# Altium footprint library 7-Connectors-12.PcbLib: 76 footprints (part 5 of 5) (continued)
## TYCO_5406203-3 [mm] "4 x RJ45 Jacks - 8 Positions" (continued)
Mechanical 15:
  lines w0.1: -0.25,0 0,0 ; 0,-0.25 0,0 ; 0,0.25 0,0 ; 0.25,0 0,0
3D body "TYCO_5406203-3.stp": height 14.55, standoff -3.94, extent -30.505,-2.916 30.505,18.42

## TYCO_5787834-1 [mm] "4 Position, Straight USB Type B Receptacle"
height 15.62
pads (6):
  round 1.7 hole 1: 1(1.25,1.605) 2(-1.25,1.605) 3(-1.25,-1.605) 4(1.25,-1.605)
  round 3 hole 2.3: 5(-6.02,-1.1) 5(6.02,-1.1)
Top Overlay:
  drawing of 188 lines, arcs and shapes, not listed
Mechanical 8:
  lines w0.1: -6.52,-1.1 -6.02,-1.1 ; -6.02,-1.6 -6.02,-1.1 ; -6.02,-0.6 -6.02,-1.1 ; -5.52,-1.1 -6.02,-1.1 ; -1.75,-1.605 -1.25,-1.605 ; -1.75,1.605 -1.25,1.605 ; -1.25,-2.105 -1.25,-1.605 ; -1.25,-1.105 -1.25,-1.605 ; -1.25,1.105 -1.25,1.605 ; -1.25,2.105 -1.25,1.605 ; -0.75,-1.605 -1.25,-1.605 ; -0.75,1.605 -1.25,1.605 ; -0.5,0 0,0 ; 0,-0.5 0,0 ; 0,0.5 0,0 ; 0.5,0 0,0 ; 0.75,-1.605 1.25,-1.605 ; 0.75,1.605 1.25,1.605 ; 1.25,-2.105 1.25,-1.605 ; 1.25,-1.105 1.25,-1.605 ; 1.25,1.105 1.25,1.605 ; 1.25,2.105 1.25,1.605 ; 1.75,-1.605 1.25,-1.605 ; 1.75,1.605 1.25,1.605 ; 5.52,-1.1 6.02,-1.1 ; 6.02,-1.6 6.02,-1.1 ; 6.02,-0.6 6.02,-1.1 ; 6.52,-1.1 6.02,-1.1
Mechanical 14:
  drawing of 314 lines, arcs and shapes, not listed
3D body "TYCO_5787834-1.stp": height 15.62, standoff -4.02, extent -7.571,-5.723 7.571,5.733

## TYCO_6367034-1 [mm] "Cage bottom For Single Port SFP  (Small Form-factor Pluggable)"
height 8.8
pads (17):
  rect 2x2 hole 1.05: 21(-30.9,7.125) 22(-20.9,7.125) 23(-10.9,7.125) 25(-25.9,-7.125) 26(-15.9,-7.125) 27(-5.9,-7.125) 28(4.1,-7.125) 29(-30.9,-1.455) 30(-10.9,-3.955) 31(-10.9,1.445)
  rect 2x2 hole 0.85: 24(-0.9,7.125)
  round 0.5 hole 0.95 unplated mask+0.25: 32(-8.1,7.125) 33(-3.4,7.125) 34(1.6,7.125) 35(-8.1,-7.125) 36(-3.4,-7.125) 37(1.6,-7.125)
Top Overlay:
  lines w0.2: -41.65,-4.605 -41.65,-3.405 ; -41.65,-0.605 -41.65,0.595 ; -41.65,3.395 -41.65,4.595 ; -36.6,-4.605 -36.6,-3.405 ; -36.6,-0.605 -36.6,0.595 ; -36.6,3.395 -36.6,4.595 ; -32.3,7.774 -42.4,7.774 -42.4,-7.774 -27.3,-7.774 ; -29.5,7.774 -22.3,7.774 ; -24.5,-7.774 -17.3,-7.774 ; -19.5,7.774 -12.3,7.774 ; -14.5,-7.774 -8.568,-7.774 ; -9.5,7.774 -8.568,7.774 ; -7.632,-7.774 -7.3,-7.774 ; -7.632,7.774 -3.868,7.774 ; -4.5,-7.774 -3.868,-7.774 ; -2.932,-7.774 1.132,-7.774 ; -2.932,7.774 -2.4,7.774 ; 0.6,7.774 1.132,7.774 ; 2.068,-7.774 2.7,-7.774 ; 2.068,7.774 6.3,7.774 6.3,5.589 ; 5.5,-7.774 6.3,-7.774 6.3,-5.599 ; 6.3,-4.011 6.3,-0.799 ; 6.3,0.789 6.3,4.001 ; -41.9,-4.905 -41.9,-4.605 -35.6,-4.605 -35.6,-4.905 -41.9,-4.905 ; -41.9,-3.405 -41.9,-3.105 -35.6,-3.105 -35.6,-3.405 -41.9,-3.405 ; -41.9,-0.905 -41.9,-0.605 -35.6,-0.605 -35.6,-0.905 -41.9,-0.905 ; -41.9,0.595 -41.9,0.895 -35.6,0.895 -35.6,0.595 -41.9,0.595 ; -41.9,3.095 -41.9,3.395 -35.6,3.395 -35.6,3.095 -41.9,3.095 ; -41.9,4.595 -41.9,4.895 -35.6,4.895 -35.6,4.595 -41.9,4.595
Mechanical 8:
  drawing of 213 lines, arcs and shapes, not listed
Mechanical 14:
  lines w0.1: -41.65,-4.605 -41.65,-3.405 ; -41.65,-0.605 -41.65,0.595 ; -41.65,3.395 -41.65,4.595 ; -36.6,-4.605 -36.6,-3.405 ; -36.6,-0.605 -36.6,0.595 ; -36.6,3.395 -36.6,4.595 ; -42.4,-7.774 6.3,-7.774 6.3,7.774 -42.4,7.774 -42.4,-7.774 ; -41.9,-4.905 -41.9,-4.605 -35.6,-4.605 -35.6,-4.905 -41.9,-4.905 ; -41.9,-3.405 -41.9,-3.105 -35.6,-3.105 -35.6,-3.405 -41.9,-3.405 ; -41.9,-0.905 -41.9,-0.605 -35.6,-0.605 -35.6,-0.905 -41.9,-0.905 ; -41.9,0.595 -41.9,0.895 -35.6,0.895 -35.6,0.595 -41.9,0.595 ; -41.9,3.095 -41.9,3.395 -35.6,3.395 -35.6,3.095 -41.9,3.095 ; -41.9,4.595 -41.9,4.895 -35.6,4.895 -35.6,4.595 -41.9,4.595
3D body "TYCO_6367034-1_(Cage Bot).stp": height 8.8, standoff -1.1, extent -42.4,-7.774 6.1,7.774

## TYCO_6367035-1 [mm] "Cage Top For Single Port SFP  (Small Form-factor Pluggable)"
height 10
pads (3):
  round 0.5 hole 0.95 unplated mask+0.25: CAGE(6.2,-4.805) CAGE(6.2,-0.005) CAGE(6.2,4.795)
Top Overlay:
  lines w0.2: -41.65,-4.605 -41.65,-3.405 ; -41.65,-0.605 -41.65,0.595 ; -41.65,3.395 -41.65,4.595 ; -36.6,-4.605 -36.6,-3.405 ; -36.6,-0.605 -36.6,0.595 ; -36.6,3.395 -36.6,4.595 ; -32.3,7.774 -42.4,7.774 -42.4,-7.774 -27.3,-7.774 ; -29.5,7.774 -22.3,7.774 ; -24.5,-7.774 -17.3,-7.774 ; -19.5,7.774 -12.3,7.774 ; -14.5,-7.774 -8.568,-7.774 ; -9.5,7.774 -8.568,7.774 ; -7.632,-7.774 -7.3,-7.774 ; -7.632,7.774 -3.868,7.774 ; -4.5,-7.774 -3.868,-7.774 ; -2.932,-7.774 1.132,-7.774 ; -2.932,7.774 -2.4,7.774 ; 0.6,7.774 1.132,7.774 ; 2.068,-7.774 2.7,-7.774 ; 2.068,7.774 6.3,7.774 6.3,5.589 ; 5.5,-7.774 6.3,-7.774 6.3,-5.599 ; 6.3,-4.011 6.3,-0.799 ; 6.3,0.789 6.3,4.001 ; -41.9,-4.905 -41.9,-4.605 -35.6,-4.605 -35.6,-4.905 -41.9,-4.905 ; -41.9,-3.405 -41.9,-3.105 -35.6,-3.105 -35.6,-3.405 -41.9,-3.405 ; -41.9,-0.905 -41.9,-0.605 -35.6,-0.605 -35.6,-0.905 -41.9,-0.905 ; -41.9,0.595 -41.9,0.895 -35.6,0.895 -35.6,0.595 -41.9,0.595 ; -41.9,3.095 -41.9,3.395 -35.6,3.395 -35.6,3.095 -41.9,3.095 ; -41.9,4.595 -41.9,4.895 -35.6,4.895 -35.6,4.595 -41.9,4.595
Mechanical 8:
  circle w0.1: c6.2,4.795 r0.425
  circle w0.1: c6.2,-0.005 r0.425
  circle w0.1: c6.2,-4.805 r0.425
  lines w0.1: -31.4,-1.455 -30.9,-1.455 ; -31.4,7.125 -30.9,7.125 ; -30.9,-1.955 -30.9,-1.455 ; -30.9,-0.955 -30.9,-1.455 ; -30.9,6.625 -30.9,7.125 ; -30.9,7.625 -30.9,7.125 ; -30.4,-1.455 -30.9,-1.455 ; -30.4,7.125 -30.9,7.125 ; -26.4,-7.125 -25.9,-7.125 ; -25.9,-7.625 -25.9,-7.125 ; -25.9,-6.625 -25.9,-7.125 ; -25.4,-7.125 -25.9,-7.125 ; -21.4,7.125 -20.9,7.125 ; -20.9,6.625 -20.9,7.125 ; -20.9,7.625 -20.9,7.125 ; -20.4,7.125 -20.9,7.125 ; -16.4,-7.125 -15.9,-7.125 ; -15.9,-7.625 -15.9,-7.125 ; -15.9,-6.625 -15.9,-7.125 ; -15.4,-7.125 -15.9,-7.125 ; -11.4,-3.955 -10.9,-3.955 ; -11.4,1.445 -10.9,1.445 ; -11.4,7.125 -10.9,7.125 ; -10.9,-4.455 -10.9,-3.955 ; -10.9,-3.455 -10.9,-3.955 ; -10.9,0.945 -10.9,1.445 ; -10.9,1.945 -10.9,1.445 ; -10.9,6.625 -10.9,7.125 ; -10.9,7.625 -10.9,7.125 ; -10.4,-3.955 -10.9,-3.955 ; -10.4,1.445 -10.9,1.445 ; -10.4,7.125 -10.9,7.125 ; -8.6,-7.125 -8.1,-7.125 ; -8.6,7.125 -8.1,7.125 ; -8.1,-7.625 -8.1,-7.125 ; -8.1,-6.625 -8.1,-7.125 ; -8.1,6.625 -8.1,7.125 ; -8.1,7.625 -8.1,7.125 ; -7.6,-7.125 -8.1,-7.125 ; -7.6,7.125 -8.1,7.125 ; -6.4,-7.125 -5.9,-7.125 ; -5.9,-7.625 -5.9,-7.125 ; -5.9,-6.625 -5.9,-7.125 ; -5.4,-7.125 -5.9,-7.125 ; -4.6,-3.805 -4.1,-3.805 -3.6,-3.805 ; -4.6,3.395 -4.1,3.395 -3.6,3.395 ; -4.1,-4.305 -4.1,3.895 ; -3.9,-7.125 -3.4,-7.125 ; -3.9,7.125 -3.4,7.125 ; -3.4,-7.625 -3.4,-7.125 ; -3.4,-6.625 -3.4,-7.125 ; -3.4,6.625 -3.4,7.125 ; -3.4,7.625 -3.4,7.125 ; -2.9,-7.125 -3.4,-7.125 ; -2.9,7.125 -3.4,7.125 ; -1.4,7.125 -0.9,7.125 ; -0.9,6.625 -0.9,7.125 ; -0.9,7.625 -0.9,7.125 ; -0.5,-4.805 0,-4.805 ; -0.5,0 0,0 ; -0.5,4.795 0,4.795 ; -0.4,7.125 -0.9,7.125 ; 0,-5.305 0,-4.805 ; 0,-4.305 0,-4.805 ; 0,-0.5 0,0 ; 0,0.5 0,0 ; 0,4.295 0,4.795 ; 0,5.295 0,4.795 ; 0.5,-4.805 0,-4.805 ; 0.5,0 0,0 ; 0.5,4.795 0,4.795 ; 1.1,-7.125 1.6,-7.125 ; 1.1,7.125 1.6,7.125 ; 1.6,-7.625 1.6,-7.125 ; 1.6,-6.625 1.6,-7.125 ; 1.6,6.625 1.6,7.125 ; 1.6,7.625 1.6,7.125 ; 2.1,-7.125 1.6,-7.125 ; 2.1,7.125 1.6,7.125 ; 3.6,-7.125 4.1,-7.125 ; 3.6,-3.405 4.1,-3.405 4.6,-3.405 ; 3.6,3.795 4.1,3.795 4.6,3.795 ; 4.1,-7.625 4.1,-7.125 ; 4.1,-6.625 4.1,-7.125 ; 4.1,-3.905 4.1,4.295 ; 4.6,-7.125 4.1,-7.125 ; 5.7,-4.805 6.2,-4.805 ; 5.7,-0.005 6.2,-0.005 ; 5.7,4.795 6.2,4.795 ; 6.2,-5.305 6.2,-4.805 ; 6.2,-4.305 6.2,-4.805 ; 6.2,-0.505 6.2,-0.005 ; 6.2,0.495 6.2,-0.005 ; 6.2,4.295 6.2,4.795 ; 6.2,5.295 6.2,4.795 ; 6.7,-4.805 6.2,-4.805 ; 6.7,-0.005 6.2,-0.005 ; 6.7,4.795 6.2,4.795
Mechanical 14:
  circle w0.1: c-26.1,3.945 r1
  circle w0.1: c-30.6,-0.005 r1
  circle w0.1: c-26.1,-3.955 r1
  circle w0.1: c-21.6,-0.005 r1
  circle w0.1: c-17.1,-3.955 r1
  circle w0.1: c-12.6,-0.005 r1
  circle w0.1: c-17.1,3.945 r1
  circle w0.1: c-8.1,3.945 r1
  circle w0.1: c-8.1,-3.955 r1
  circle w0.1: c-3.6,-0.005 r1
  circle w0.1: c0.9,-3.955 r1
  circle w0.1: c0.9,3.945 r1
  lines w0.1: -41.65,-4.605 -41.65,-3.405 ; -41.65,-0.605 -41.65,0.595 ; -41.65,3.395 -41.65,4.595 ; -36.6,-4.605 -36.6,-3.405 ; -36.6,-0.605 -36.6,0.595 ; -36.6,3.395 -36.6,4.595 ; -42.4,-7.774 6.3,-7.774 6.3,7.774 -42.4,7.774 -42.4,-7.774 ; -41.9,-4.905 -41.9,-4.605 -35.6,-4.605 -35.6,-4.905 -41.9,-4.905 ; -41.9,-3.405 -41.9,-3.105 -35.6,-3.105 -35.6,-3.405 -41.9,-3.405 ; -41.9,-0.905 -41.9,-0.605 -35.6,-0.605 -35.6,-0.905 -41.9,-0.905 ; -41.9,0.595 -41.9,0.895 -35.6,0.895 -35.6,0.595 -41.9,0.595 ; -41.9,3.095 -41.9,3.395 -35.6,3.395 -35.6,3.095 -41.9,3.095 ; -41.9,4.595 -41.9,4.895 -35.6,4.895 -35.6,4.595 -41.9,4.595
3D body "TYCO_6367035-1_(Cage Top).stp": height 10.34, standoff -1.19, extent -42.4,-7.774 6.3,7.886

## USB-CG [mm]
height 8.58
pads (6):
  rect 1.2x2 smd mask+0.051: 1(3.43,1.7) 2(0.975,1.7) 3(-0.975,1.7)
  rect 1.2x2 smd mask+0: 4(-3.43,1.7)
  oval 1.55x3.2 hole 0.8 slot 2.2 at 90 deg unplated: 5(-5.95,-0.955) 6(5.95,-0.955)
via -2.25,-0.9 diameter 1.2 hole 1.2
via 2.25,-0.9 diameter 1.2 hole 1.2
Top Overlay:
  lines w0.025: -6,-3.714 -3,-3.714 ; -3.78,0 -3.78,2.38 -3.08,2.38 -3.08,0 ; -3.78,0.269 -3.08,0.269 ; -3.78,0.904 -3.08,0.904 ; -1.6,-3.714 1.6,-3.714 ; -1.325,0 -1.325,2.38 -0.625,2.38 ; -1.325,0.269 -0.625,0.269 ; -1.325,0.904 -0.625,0.904 ; -0.625,0 -0.625,2.377 ; 0.622,0.269 1.322,0.269 ; 0.625,0 0.625,2.38 1.325,2.38 ; 0.625,0.904 1.325,0.904 ; 1.325,0 1.325,2.377 ; 3,-3.714 6,-3.714 ; 3.08,0 3.08,2.38 3.78,2.38 3.78,0 ; 3.08,0.269 3.78,0.269 ; 3.08,0.904 3.78,0.904
  lines w0.076: 0,-0.432 0,0 ; -5.98,-4.831 5.98,-4.831 5.98,0 -5.98,0 -5.98,-4.831
3D body "usb_cg.stp": height 3.52, standoff -3.08, extent -6.006,-18.881 5.994,2.21

## USB-FZ RS [mm]
height 8.58
pads (6):
  round 3 hole 2 mask+0.07: 0(-6.02,0) 0(6.02,0)
  round 1.524 hole 0.8 mask+0.07: 1/VBUS(1.25,4.71) 3/D+(-1.25,2.71) 4/G(1.25,2.71)
  round 1.524 hole 0.8: 2/D-(-1.25,4.71)
Top Overlay:
  lines w0.254: -6,-0.33 -6,-10.4 6,-10.4 6,-0.533 ; -5.994,0.026 -5.994,6.147 5.994,6.147 5.994,0.026
3D body "usb-b_rs.stp": height 10.9, standoff -3.15, extent -6.063,-10.26 5.937,5.94

## USB-M1 [mm]
height 8.58
pads (8):
  rect 1.016x2 smd mask+0.051: 1(-3.5,4.1) 2(-1,4.1) 3(1,4.1) 4(3.5,4.1)
  oval 1.422x2.4 hole 0.8 slot 1.5 at 90 deg mask+0: 5(6.4,1.9) 6(6.4,-4.1) 7(-6.4,-4.1)
  oval 1.44x2.4 hole 0.8 slot 1.5 at 90 deg mask+0: 8(-6.4,1.9)
Top Overlay:
  lines w0.254: -6.604,-4.786 -6.604,3.507 6.604,3.507 6.604,-4.786
3D body "usb-m1.stp": height 6.2, standoff -1.57, extent -6.575,-7.469 6.525,4.267

## USB-MINI-1 [mil]
height 337.8
pads (7):
  rect 16x52 smd mask+2: 1(-50,53) 2(-25,53) 3(0,53) 4(25,53)
  rect 16x52 smd mask+0: 5(50,53)
  oval 42x86.61 hole 23.62 slot 62.99 at 90 deg mask+0: 6(111,-53) 7(-111,-53)
Top Overlay:
  lines w6: -157,-73 -157,65 157,65 157,-73
3D body "miniusb-1.stp": height 153.54, standoff -49.21, extent -151.57,-143.67 151.57,59

## WINSLOW_W9571 [mm] "SOP 44 Pin, Pitch 0.8mm to DiIP 44 Pin, Pitch 2.5mm, Row Spacing 15.24mm, Socket Adapter"
height 3.8
pads (44):
  rect 1.5x1.5 hole 0.9: 1(-7.62,25.4)
  round 1.5 hole 0.9: 2(-7.62,22.86) 3(-7.62,20.32) 4(-7.62,17.78) 5(-7.62,15.24) 6(-7.62,12.7) 7(-7.62,10.16) 8(-7.62,7.62) 9(-7.62,5.08) 10(-7.62,2.54) 11(-7.62,0) 12(-7.62,-2.54) 13(-7.62,-5.08) 14(-7.62,-7.62) 15(-7.62,-10.16) 16(-7.62,-12.7) 17(-7.62,-15.24) 18(-7.62,-17.78) 19(-7.62,-20.32) 20(-7.62,-22.86) 21(-7.62,-25.4) 22(-7.62,-27.94) 23(7.62,-27.94) 24(7.62,-25.4) 25(7.62,-22.86) 26(7.62,-20.32) 27(7.62,-17.78) 28(7.62,-15.24) 29(7.62,-12.7) 30(7.62,-10.16) 31(7.62,-7.62) 32(7.62,-5.08) 33(7.62,-2.54) 34(7.62,0) 35(7.62,2.54) 36(7.62,5.08) 37(7.62,7.62) 38(7.62,10.16) 39(7.62,12.7) 40(7.62,15.24) 41(7.62,17.78) 42(7.62,20.32) 43(7.62,22.86) 44(7.62,25.4)
Top Overlay:
  drawing of 189 lines, arcs and shapes, not listed
Mechanical 8:
  drawing of 180 lines, arcs and shapes, not listed
Mechanical 14:
  drawing of 233 lines, arcs and shapes, not listed
3D body "WINSLOW_W9571.stp": height 3.84, standoff -3.17, extent -10.15,-30.47 10.15,27.93

## WURTH_651005136521 [mm] "Mini USB Type B Horizontal 5 Contacts"
height 3.9
pads (9):
  round 1.2 hole 0.6: 1(-1.6,0) 2(-0.8,-1.2) 3(0,0) 4(0.8,-1.2) 5(1.6,0)
  oval 1.6x2.3 hole 0.9 slot 1.6 at 90 deg: 6(-3.65,-5.55) 6(-3.65,-0.9) 6(3.65,-5.55) 6(3.65,-0.9)
Top Overlay:
  lines w0.2: -3.85,-6.982 -3.85,-8.7 3.85,-8.7 3.85,-6.982 ; -3.85,-4.118 -3.85,-2.332 ; -3.35,-8.7 -3.35,-6.958 ; -3.35,-4.142 -3.35,-2.308 ; -2.875,-6.681 -2.875,-7.65 ccw(c-2.775,-7.65) -2.775,-7.75 -1.725,-7.75 ccw(c-1.725,-7.65) -1.625,-7.65 -1.625,-4.4 ccw(c-1.725,-4.4) -1.725,-4.3 -2.775,-4.3 ccw(c-2.775,-4.4) -2.875,-4.4 -2.875,-4.419 ; -2.694,-4.3 cw(c-2.694,-4.396) -2.597,-4.396 -2.509,-6.881 ccw(c-2.25,-6.881) -1.991,-6.881 -1.904,-4.396 ; -2.513,-6.771 ccw(c-2.25,-6.769) -1.987,-6.769 ; -2.036,-0.9 -2.15,-0.9 ccw(c-2.15,-1) -2.25,-1 -2.25,-1.4 ccw(c-2.15,-1.4) -2.15,-1.5 -1.754,-1.5 ; -1.904,-4.403 cw(c-1.801,-4.403) -1.801,-4.3 ; -1.1,-2.154 -1.1,-2.6 ccw(c-1,-2.6) -1,-2.7 1,-2.7 ccw(c1,-2.6) 1.1,-2.6 1.1,-2.154 ; -0.661,-4.328 cw(c-0.425,-4.336) -0.425,-4.1 0.425,-4.1 cw(c0.425,-4.336) 0.661,-4.328 ; -0.45,-2.137 -0.45,-2.15 ccw(c-0.35,-2.15) -0.35,-2.25 0.35,-2.25 ccw(c0.35,-2.15) 0.45,-2.15 0.45,-2.137 ; 1.754,-1.5 2.15,-1.5 ccw(c2.15,-1.4) 2.25,-1.4 2.25,-1 ccw(c2.15,-1) 2.15,-0.9 2.036,-0.9 ; 1.802,-4.3 cw(c1.802,-4.396) 1.898,-4.396 1.987,-6.881 ccw(c2.246,-6.881) 2.504,-6.881 2.592,-4.396 ; 1.983,-6.771 ccw(c2.246,-6.769) 2.508,-6.769 ; 2.591,-4.403 cw(c2.695,-4.403) 2.695,-4.3 ; 2.871,-6.676 2.871,-7.65 cw(c2.771,-7.65) 2.771,-7.75 1.721,-7.75 cw(c1.721,-7.65) 1.621,-7.65 1.621,-4.4 cw(c1.721,-4.4) 1.721,-4.3 2.771,-4.3 cw(c2.771,-4.4) 2.871,-4.4 2.871,-4.424 ; 3.35,-8.7 3.35,-6.958 ; 3.35,-4.142 3.35,-2.308 ; 3.85,-4.118 3.85,-2.332 ; -1.147,-7.653 ccw(c-1.047,-7.657) -1.047,-7.757 -0.872,-7.757 ccw(c-0.872,-7.657) -0.772,-7.66 -0.654,-4.129 cw(c-0.418,-4.137) -0.418,-3.901 0.418,-3.901 cw(c0.418,-4.137) 0.654,-4.129 0.772,-7.653 ccw(c0.872,-7.65) 0.872,-7.75 1.047,-7.75 ccw(c1.047,-7.65) 1.147,-7.647 0.999,-3.347 ccw(c0.9,-3.35) 0.9,-3.25 -0.9,-3.25 ccw(c-0.9,-3.35) -0.999,-3.347 -1.147,-7.653
Mechanical 8:
  lines w0.1: -3.9,-5.9 -3.65,-5.9 ; -3.9,-5.55 -3.65,-5.55 ; -3.9,-5.2 -3.65,-5.2 ; -3.9,-1.25 -3.65,-1.25 ; -3.9,-0.9 -3.65,-0.9 ; -3.9,-0.55 -3.65,-0.55 ; -3.65,-6.15 -3.65,-5.9 ; -3.65,-5.8 -3.65,-5.55 ; -3.65,-5.3 -3.65,-5.55 ; -3.65,-4.95 -3.65,-5.2 ; -3.65,-1.5 -3.65,-1.25 ; -3.65,-1.15 -3.65,-0.9 ; -3.65,-0.65 -3.65,-0.9 ; -3.65,-0.3 -3.65,-0.55 ; -3.4,-5.9 -3.65,-5.9 ; -3.4,-5.55 -3.65,-5.55 ; -3.4,-5.2 -3.65,-5.2 ; -3.4,-1.25 -3.65,-1.25 ; -3.4,-0.9 -3.65,-0.9 ; -3.4,-0.55 -3.65,-0.55 ; -2.1,0 -1.6,0 ; -1.6,-0.5 -1.6,0 ; -1.6,0.5 -1.6,0 ; -1.3,-1.2 -0.8,-1.2 ; -1.1,0 -1.6,0 ; -0.8,-1.7 -0.8,-1.2 ; -0.8,-0.7 -0.8,-1.2 ; -0.5,-4.5 0,-4.5 ; -0.5,0 0,0 ; -0.3,-1.2 -0.8,-1.2 ; 0,-5 0,-4.5 ; 0,-4 0,-4.5 ; 0,-0.5 0,0 ; 0,0.5 0,0 ; 0.3,-1.2 0.8,-1.2 ; 0.5,-4.5 0,-4.5 ; 0.5,0 0,0 ; 0.8,-1.7 0.8,-1.2 ; 0.8,-0.7 0.8,-1.2 ; 1.1,0 1.6,0 ; 1.3,-1.2 0.8,-1.2 ; 1.6,-0.5 1.6,0 ; 1.6,0.5 1.6,0 ; 2.1,0 1.6,0 ; 3.4,-5.9 3.65,-5.9 ; 3.4,-5.55 3.65,-5.55 ; 3.4,-5.2 3.65,-5.2 ; 3.4,-1.25 3.65,-1.25 ; 3.4,-0.9 3.65,-0.9 ; 3.4,-0.55 3.65,-0.55 ; 3.65,-6.15 3.65,-5.9 ; 3.65,-5.8 3.65,-5.55 ; 3.65,-5.3 3.65,-5.55 ; 3.65,-4.95 3.65,-5.2 ; 3.65,-1.5 3.65,-1.25 ; 3.65,-1.15 3.65,-0.9 ; 3.65,-0.65 3.65,-0.9 ; 3.65,-0.3 3.65,-0.55 ; 3.9,-5.9 3.65,-5.9 ; 3.9,-5.55 3.65,-5.55 ; 3.9,-5.2 3.65,-5.2 ; 3.9,-1.25 3.65,-1.25 ; 3.9,-0.9 3.65,-0.9 ; 3.9,-0.55 3.65,-0.55 ; -4.1,-5.9 ccw(c-3.65,-5.9) -3.2,-5.9 -3.2,-5.2 ccw(c-3.65,-5.2) -4.1,-5.2 -4.1,-5.9 ; -4.1,-1.25 ccw(c-3.65,-1.25) -3.2,-1.25 -3.2,-0.55 ccw(c-3.65,-0.55) -4.1,-0.55 -4.1,-1.25 ; 3.2,-5.9 ccw(c3.65,-5.9) 4.1,-5.9 4.1,-5.2 ccw(c3.65,-5.2) 3.2,-5.2 3.2,-5.9 ; 3.2,-1.25 ccw(c3.65,-1.25) 4.1,-1.25 4.1,-0.55 ccw(c3.65,-0.55) 3.2,-0.55 3.2,-1.25
Mechanical 14:
  lines w0.1: -3.85,-5.955 cw(c-3.675,-5.595) -4.075,-5.595 -4.075,-5.505 cw(c-3.675,-5.505) -3.85,-5.145 ; -3.85,-1.305 cw(c-3.675,-0.945) -4.075,-0.945 -4.075,-0.855 cw(c-3.675,-0.855) -3.85,-0.495 ; -3.35,-8.7 -3.35,-0.3 ; -2.694,-4.3 cw(c-2.694,-4.396) -2.597,-4.396 -2.509,-6.881 ccw(c-2.25,-6.881) -1.991,-6.881 -1.904,-4.396 ; -2.513,-6.771 ccw(c-2.25,-6.769) -1.987,-6.769 ; -1.904,-4.403 cw(c-1.801,-4.403) -1.801,-4.3 ; -1.8,-0.3 -1.8,0.125 -1.4,0.125 -1.4,-0.3 ; -0.661,-4.328 cw(c-0.425,-4.336) -0.425,-4.1 0.425,-4.1 cw(c0.425,-4.336) 0.661,-4.328 ; -0.55,-0.9 cw(c-0.55,-1) -0.45,-1 -0.45,-2.15 ccw(c-0.35,-2.15) -0.35,-2.25 0.35,-2.25 ccw(c0.35,-2.15) 0.45,-2.15 0.45,-1 cw(c0.55,-1) 0.55,-0.9 ; -0.2,-0.3 -0.2,0.125 0.2,0.125 0.2,-0.3 ; 1.4,-0.3 1.4,0.125 1.8,0.125 1.8,-0.3 ; 1.802,-4.3 cw(c1.802,-4.396) 1.898,-4.396 1.987,-6.881 ccw(c2.246,-6.881) 2.504,-6.881 2.592,-4.396 ; 1.983,-6.771 ccw(c2.246,-6.769) 2.508,-6.769 ; 2.591,-4.403 cw(c2.695,-4.403) 2.695,-4.3 ; 3.35,-8.7 3.35,-0.3 ; 3.85,-5.955 ccw(c3.675,-5.595) 4.075,-5.595 4.075,-5.505 ccw(c3.675,-5.505) 3.85,-5.145 ; 3.85,-1.305 ccw(c3.675,-0.945) 4.075,-0.945 4.075,-0.855 ccw(c3.675,-0.855) 3.85,-0.495 ; -3.85,-8.7 3.85,-8.7 3.85,-0.3 -3.85,-0.3 -3.85,-8.7 ; -2.875,-7.65 ccw(c-2.775,-7.65) -2.775,-7.75 -1.725,-7.75 ccw(c-1.725,-7.65) -1.625,-7.65 -1.625,-4.4 ccw(c-1.725,-4.4) -1.725,-4.3 -2.775,-4.3 ccw(c-2.775,-4.4) -2.875,-4.4 -2.875,-7.65 ; -2.25,-1.4 ccw(c-2.15,-1.4) -2.15,-1.5 -1.2,-1.5 cw(c-1.2,-1.6) -1.1,-1.6 -1.1,-2.6 ccw(c-1,-2.6) -1,-2.7 1,-2.7 ccw(c1,-2.6) 1.1,-2.6 1.1,-1.6 cw(c1.2,-1.6) 1.2,-1.5 2.15,-1.5 ccw(c2.15,-1.4) 2.25,-1.4 2.25,-1 ccw(c2.15,-1) 2.15,-0.9 -2.15,-0.9 ccw(c-2.15,-1) -2.25,-1 -2.25,-1.4 ; -1.147,-7.653 ccw(c-1.047,-7.657) -1.047,-7.757 -0.872,-7.757 ccw(c-0.872,-7.657) -0.772,-7.66 -0.654,-4.129 cw(c-0.418,-4.137) -0.418,-3.901 0.418,-3.901 cw(c0.418,-4.137) 0.654,-4.129 0.772,-7.653 ccw(c0.872,-7.65) 0.872,-7.75 1.047,-7.75 ccw(c1.047,-7.65) 1.147,-7.647 0.999,-3.347 ccw(c0.9,-3.35) 0.9,-3.25 -0.9,-3.25 ccw(c-0.9,-3.35) -0.999,-3.347 -1.147,-7.653 ; 1.621,-7.65 ccw(c1.721,-7.65) 1.721,-7.75 2.771,-7.75 ccw(c2.771,-7.65) 2.871,-7.65 2.871,-4.4 ccw(c2.771,-4.4) 2.771,-4.3 1.721,-4.3 ccw(c1.721,-4.4) 1.621,-4.4 1.621,-7.65
3D body "WURTH_651005136521.stp": height 3.9, standoff -2.6, extent -4.075,-8.7 4.075,0.125

## YAMAICHI_IC51-2084-1052-9 [mm] "Through Hole Socket for 0.5mm Pitch 208 Pins QFP, Body 58 x52mm"
height 18.5
pads (212):
  oval 1.4x1 hole 0.7: 1(-15.4,12.75) 2(-20.48,12.25) 3(-17.94,11.75) 4(-15.4,11.25) 5(-20.48,10.75) 6(-17.94,10.25) 7(-15.4,9.75) 8(-20.48,9.25) 9(-17.94,8.75) 10(-15.4,8.25) 11(-20.48,7.75) 12(-17.94,7.25) 13(-15.4,6.75) 14(-20.48,6.25) 15(-17.94,5.75) 16(-15.4,5.25) 17(-20.48,4.75) 18(-17.94,4.25) 19(-15.4,3.75) 20(-20.48,3.25) 21(-17.94,2.75) 22(-15.4,2.25) 23(-20.48,1.75) 24(-17.94,1.25) 25(-15.4,0.75) 26(-20.48,0.25) 27(-17.94,-0.25) 28(-15.4,-0.75) 29(-20.48,-1.25) 30(-17.94,-1.75) 31(-15.4,-2.25) 32(-20.48,-2.75) 33(-17.94,-3.25) 34(-15.4,-3.75) 35(-20.48,-4.25) 36(-17.94,-4.75) 37(-15.4,-5.25) 38(-20.48,-5.75) 39(-17.94,-6.25) 40(-15.4,-6.75) 41(-20.48,-7.25) 42(-17.94,-7.75) 43(-15.4,-8.25) 44(-20.48,-8.75) 45(-17.94,-9.25) 46(-15.4,-9.75) 47(-20.48,-10.25) 48(-17.94,-10.75) 49(-15.4,-11.25) 50(-20.48,-11.75) 51(-17.94,-12.25) 52(-15.4,-12.75) 105(15.4,-12.75) 106(20.48,-12.25) 107(17.94,-11.75) 108(15.4,-11.25) 109(20.48,-10.75) 110(17.94,-10.25) 111(15.4,-9.75) 112(20.48,-9.25) 113(17.94,-8.75) 114(15.4,-8.25) 115(20.48,-7.75) 116(17.94,-7.25) 117(15.4,-6.75) 118(20.48,-6.25) 119(17.94,-5.75) 120(15.4,-5.25) 121(20.48,-4.75) 122(17.94,-4.25) 123(15.4,-3.75) 124(20.48,-3.25) 125(17.94,-2.75) 126(15.4,-2.25) 127(20.48,-1.75) 128(17.94,-1.25) 129(15.4,-0.75) 130(20.48,-0.25) 131(17.94,0.25) 132(15.4,0.75) 133(20.48,1.25) 134(17.94,1.75) 135(15.4,2.25) 136(20.48,2.75) 137(17.94,3.25) 138(15.4,3.75) 139(20.48,4.25) 140(17.94,4.75) 141(15.4,5.25) 142(20.48,5.75) 143(17.94,6.25) 144(15.4,6.75) 145(20.48,7.25) 146(17.94,7.75) 147(15.4,8.25) 148(20.48,8.75) 149(17.94,9.25) 150(15.4,9.75) 151(20.48,10.25) 152(17.94,10.75) 153(15.4,11.25) 154(20.48,11.75) 155(17.94,12.25) 156(15.4,12.75)
  oval 1x1.4 hole 0.7: 53(-12.75,-15.4) 54(-12.25,-20.48) 55(-11.75,-17.94) 56(-11.25,-15.4) 57(-10.75,-20.48) 58(-10.25,-17.94) 59(-9.75,-15.4) 60(-9.25,-20.48) 61(-8.75,-17.94) 62(-8.25,-15.4) 63(-7.75,-20.48) 64(-7.25,-17.94) 65(-6.75,-15.4) 66(-6.25,-20.48) 67(-5.75,-17.94) 68(-5.25,-15.4) 69(-4.75,-20.48) 70(-4.25,-17.94) 71(-3.75,-15.4) 72(-3.25,-20.48) 73(-2.75,-17.94) 74(-2.25,-15.4) 75(-1.75,-20.48) 76(-1.25,-17.94) 77(-0.75,-15.4) 78(-0.25,-20.48) 79(0.25,-17.94) 80(0.75,-15.4) 81(1.25,-20.48) 82(1.75,-17.94) 83(2.25,-15.4) 84(2.75,-20.48) 85(3.25,-17.94) 86(3.75,-15.4) 87(4.25,-20.48) 88(4.75,-17.94) 89(5.25,-15.4) 90(5.75,-20.48) 91(6.25,-17.94) 92(6.75,-15.4) 93(7.25,-20.48) 94(7.75,-17.94) 95(8.25,-15.4) 96(8.75,-20.48) 97(9.25,-17.94) 98(9.75,-15.4) 99(10.25,-20.48) 100(10.75,-17.94) 101(11.25,-15.4) 102(11.75,-20.48) 103(12.25,-17.94) 104(12.75,-15.4) 157(12.75,15.4) 158(12.25,20.48) 159(11.75,17.94) 160(11.25,15.4) 161(10.75,20.48) 162(10.25,17.94) 163(9.75,15.4) 164(9.25,20.48) 165(8.75,17.94) 166(8.25,15.4) 167(7.75,20.48) 168(7.25,17.94) 169(6.75,15.4) 170(6.25,20.48) 171(5.75,17.94) 172(5.25,15.4) 173(4.75,20.48) 174(4.25,17.94) 175(3.75,15.4) 176(3.25,20.48) 177(2.75,17.94) 178(2.25,15.4) 179(1.75,20.48) 180(1.25,17.94) 181(0.75,15.4) 182(0.25,20.48) 183(-0.25,17.94) 184(-0.75,15.4) 185(-1.25,20.48) 186(-1.75,17.94) 187(-2.25,15.4) 188(-2.75,20.48) 189(-3.25,17.94) 190(-3.75,15.4) 191(-4.25,20.48) 192(-4.75,17.94) 193(-5.25,15.4) 194(-5.75,20.48) 195(-6.25,17.94) 196(-6.75,15.4) 197(-7.25,20.48) 198(-7.75,17.94) 199(-8.25,15.4) 200(-8.75,20.48) 201(-9.25,17.94) 202(-9.75,15.4) 203(-10.25,20.48) 204(-10.75,17.94) 205(-11.25,15.4) 206(-11.75,20.48) 207(-12.25,17.94) 208(-12.75,15.4)
  round 6.2 hole 3.2: 209(-20,20) 210(-20,-20) 211(20,-20) 212(20,20)
Top Overlay:
  circle w0.25: c-15.375,14.06 r0.125
  lines w0.2: -29.112,20 -29.112,25 -24,25 ; -28.838,-20 -28.838,-25 -24,-25 ; -27.997,-20 -27.997,20 ; -26.5,-25 -26.5,-20 ; -26.5,20 -26.5,25 ; -24,-20 -24,-26 26,-26 29,-23 29,23 26,26 -24,26 -24,20 ; -23.4,-20 -30.5,-20 -30.5,20 -23.4,20 ; 29,-19 35,-19 35,19 29,19 ; 29,-12 35,-12 ; 29,-6.5 35,-6.5 ; 29,6.5 35,6.5 ; 29,12 35,12 ; 31,-6.5 31,6.5 ; 33,-6.5 33,6.5
Mechanical 8:
  drawing of 874 lines, arcs and shapes, not listed
  text "Fixing Screw Standoff Height = 4mm" at -5.715,-23.495 h0.6
Mechanical 14:
  lines w0.1: -29.112,20 -29.112,25 -24,25 ; -28.838,-20 -28.838,-25 -24,-25 ; -27.997,-20 -27.997,20 ; -26.5,-25 -26.5,-20 ; -26.5,20 -26.5,25 ; -24,-20 -24,-26 26,-26 29,-23 29,23 26,26 -24,26 -24,20 ; -18.017,-20 -18.017,20 ; 20,-26 20,26 ; 29,-19 35,-19 35,19 29,19 ; 29,-12 35,-12 ; 29,-6.5 35,-6.5 ; 29,6.5 35,6.5 ; 29,12 35,12 ; 31,-6.5 31,6.5 ; 33,-6.5 33,6.5 ; -30.5,-20 -30.5,20 -12.5,20 -12.5,-20 -30.5,-20
3D body "YAMAICHI_IC51-2084-1052-9.stp": height 18.5, standoff -2.5, extent -30.5,-26 35,26